# Altium schematic symbol library jlcpcb_2025_04_capacitors_extended_0201.schlib: 1175 symbols (part 4 of 7) (continued)
## GJM0335C1HR20BB01D
designator C?  Capacitance: 0.2pF  (hidden comment: *)
Capacitor, Ceramic (MLCC), 0.2pF, SMD 0201; Manufacturer: Murata Electronics; Manufacturer Part Number: GJM0335C1HR20BB01D; Package Size: 0201; JLCPCB Basic Part: No; JLCPCB Part Number: C913472; Supplier 1: LCSC; Category: Capacitors - MLCC; Supplier Part Number 1: C913472; RoHS: Yes; ComponentLink1Description: Datasheet; ComponentLink1URL: https://wmsc.lcsc.com/wmsc/upload/file/pdf/v2/lcsc/2308111814_Murata-Electronics-GJM0335C1HR20BB01D_C913472.pdf; ComponentLink2Description: JLCPCB Part URL; ComponentLink2URL: https://jlcpcb.com/partdetail/C913472; ComponentLink3Description: LCSC Part URL; ComponentLink3URL: https://lcsc.com/product-detail/Multilayer-Ceramic-Capacitors-MLCC---SMD-SMT_Murata-Electronics-Murata-Electronics-GJM0335C1HR20BB01D_C913472.html
footprint CAP-0201 (0201 (0603M) Capacitor)
pins: 1, 2

## GJM0335C1HR20WB01D
designator C?  Capacitance: 0.2pF  (hidden comment: *)
Capacitor, Ceramic (MLCC), 0.2pF, 50V, C0G, SMD 0201; Manufacturer: Murata Electronics; Manufacturer Part Number: GJM0335C1HR20WB01D; Package Size: 0201; JLCPCB Basic Part: No; JLCPCB Part Number: C2980610; Supplier 1: LCSC; Category: Capacitors - MLCC; Supplier Part Number 1: C2980610; Voltage Rating: 50V; Temperature Coefficient: C0G; RoHS: Yes; ComponentLink1Description: Datasheet; ComponentLink1URL: https://wmsc.lcsc.com/wmsc/upload/file/pdf/v2/lcsc/2203071730_Murata-Electronics-GJM0335C1HR20WB01D_C2980610.pdf; ComponentLink2Description: JLCPCB Part URL; ComponentLink2URL: https://jlcpcb.com/partdetail/C2980610; ComponentLink3Description: LCSC Part URL; ComponentLink3URL: https://lcsc.com/product-detail/Multilayer-Ceramic-Capacitors-MLCC---SMD-SMT_Murata-Electronics-Murata-Electronics-GJM0335C1HR20WB01D_C2980610.html
footprint CAP-0201 (0201 (0603M) Capacitor)
pins: 1, 2

## GJM0335C1HR30WB01D
designator C?  Capacitance: 0.3pF  (hidden comment: *)
Capacitor, Ceramic (MLCC), 0.3pF, 50V, C0G, SMD 0201; Manufacturer: Murata Electronics; Manufacturer Part Number: GJM0335C1HR30WB01D; Package Size: 0201; JLCPCB Basic Part: No; JLCPCB Part Number: C3904589; Supplier 1: LCSC; Category: Capacitors - MLCC; Supplier Part Number 1: C3904589; Voltage Rating: 50V; Temperature Coefficient: C0G; RoHS: Yes; ComponentLink1Description: Datasheet; ComponentLink1URL: https://wmsc.lcsc.com/wmsc/upload/file/pdf/v2/lcsc/2308111807_Murata-Electronics-GJM0335C1HR30WB01D_C3904589.pdf; ComponentLink2Description: JLCPCB Part URL; ComponentLink2URL: https://jlcpcb.com/partdetail/C3904589; ComponentLink3Description: LCSC Part URL; ComponentLink3URL: https://lcsc.com/product-detail/Multilayer-Ceramic-Capacitors-MLCC---SMD-SMT_Murata-Electronics-Murata-Electronics-GJM0335C1HR30WB01D_C3904589.html
footprint CAP-0201 (0201 (0603M) Capacitor)
pins: 1, 2

## GJM0335C1HR40WB01D
designator C?  Capacitance: 0.4pF  (hidden comment: *)
Capacitor, Ceramic (MLCC), 0.4pF, 50V, null, SMD 0201; Manufacturer: Murata Electronics; Manufacturer Part Number: GJM0335C1HR40WB01D; Package Size: 0201; JLCPCB Basic Part: No; JLCPCB Part Number: C2169044; Supplier 1: LCSC; Category: Capacitors - MLCC; Supplier Part Number 1: C2169044; Voltage Rating: 50V; Temperature Coefficient: null; RoHS: Yes; ComponentLink1Description: Datasheet; ComponentLink1URL: https://wmsc.lcsc.com/wmsc/upload/file/pdf/v2/lcsc/2202040330_Murata-Electronics-GJM0335C1HR40WB01D_C2169044.pdf; ComponentLink2Description: JLCPCB Part URL; ComponentLink2URL: https://jlcpcb.com/partdetail/C2169044; ComponentLink3Description: LCSC Part URL; ComponentLink3URL: https://lcsc.com/product-detail/Multilayer-Ceramic-Capacitors-MLCC---SMD-SMT_Murata-Electronics-Murata-Electronics-GJM0335C1HR40WB01D_C2169044.html
footprint CAP-0201 (0201 (0603M) Capacitor)
pins: 1, 2

## GJM0335C1HR50WB01D
designator C?  Capacitance: 0.5pF  (hidden comment: *)
Capacitor, Ceramic (MLCC), 0.5pF, null, null, SMD 0201; Manufacturer: Murata Electronics; Manufacturer Part Number: GJM0335C1HR50WB01D; Package Size: 0201; JLCPCB Basic Part: No; JLCPCB Part Number: C237424; Supplier 1: LCSC; Category: Capacitors - MLCC; Supplier Part Number 1: C237424; Voltage Rating: null; Temperature Coefficient: null; RoHS: Yes; ComponentLink1Description: Datasheet; ComponentLink1URL: https://wmsc.lcsc.com/wmsc/upload/file/pdf/v2/lcsc/2105241208_Murata-Electronics-GJM0335C1HR50WB01D_C237424.pdf; ComponentLink2Description: JLCPCB Part URL; ComponentLink2URL: https://jlcpcb.com/partdetail/C237424; ComponentLink3Description: LCSC Part URL; ComponentLink3URL: https://lcsc.com/product-detail/Multilayer-Ceramic-Capacitors-MLCC---SMD-SMT_Murata-Electronics-Murata-Electronics-GJM0335C1HR50WB01D_C237424.html
footprint CAP-0201 (0201 (0603M) Capacitor)
pins: 1, 2

## GJM0335C1HR60BB01D
designator C?  Capacitance: 0.6pF  (hidden comment: *)
Capacitor, Ceramic (MLCC), 0.6pF, 50V, C0G, SMD 0201; Manufacturer: Murata Electronics; Manufacturer Part Number: GJM0335C1HR60BB01D; Package Size: 0201; JLCPCB Basic Part: No; JLCPCB Part Number: C161296; Supplier 1: LCSC; Category: Capacitors - MLCC; Supplier Part Number 1: C161296; Voltage Rating: 50V; Temperature Coefficient: C0G; RoHS: Yes; ComponentLink1Description: Datasheet; ComponentLink1URL: https://wmsc.lcsc.com/wmsc/upload/file/pdf/v2/lcsc/1811081532_Murata-Electronics-GJM0335C1HR60BB01D_C161296.pdf; ComponentLink2Description: JLCPCB Part URL; ComponentLink2URL: https://jlcpcb.com/partdetail/C161296; ComponentLink3Description: LCSC Part URL; ComponentLink3URL: https://lcsc.com/product-detail/Multilayer-Ceramic-Capacitors-MLCC---SMD-SMT_Murata-Electronics-Murata-Electronics-GJM0335C1HR60BB01D_C161296.html
footprint CAP-0201 (0201 (0603M) Capacitor)
pins: 1, 2

## GJM0335C1HR60WB01D
designator C?  Capacitance: 0.6pF  (hidden comment: *)
Capacitor, Ceramic (MLCC), 0.6pF, 50V, C0G, SMD 0201; Manufacturer: Murata Electronics; Manufacturer Part Number: GJM0335C1HR60WB01D; Package Size: 0201; JLCPCB Basic Part: No; JLCPCB Part Number: C710747; Supplier 1: LCSC; Category: Capacitors - MLCC; Supplier Part Number 1: C710747; Voltage Rating: 50V; Temperature Coefficient: C0G; RoHS: Yes; ComponentLink1Description: Datasheet; ComponentLink1URL: https://wmsc.lcsc.com/wmsc/upload/file/pdf/v2/lcsc/2210190600_Murata-Electronics-GJM0335C1HR60WB01D_C710747.pdf; ComponentLink2Description: JLCPCB Part URL; ComponentLink2URL: https://jlcpcb.com/partdetail/C710747; ComponentLink3Description: LCSC Part URL; ComponentLink3URL: https://lcsc.com/product-detail/Multilayer-Ceramic-Capacitors-MLCC---SMD-SMT_Murata-Electronics-Murata-Electronics-GJM0335C1HR60WB01D_C710747.html
footprint CAP-0201 (0201 (0603M) Capacitor)
pins: 1, 2

## GJM0335C1HR75BB01D
designator C?  Capacitance: 0.75pF  (hidden comment: *)
Capacitor, Ceramic (MLCC), 0.75pF, SMD 0201; Manufacturer: Murata Electronics; Manufacturer Part Number: GJM0335C1HR75BB01D; Package Size: 0201; JLCPCB Basic Part: No; JLCPCB Part Number: C909840; Supplier 1: LCSC; Category: Capacitors - MLCC; Supplier Part Number 1: C909840; RoHS: Yes; ComponentLink1Description: Datasheet; ComponentLink1URL: https://wmsc.lcsc.com/wmsc/upload/file/pdf/v2/lcsc/2304140030_Murata-Electronics-GJM0335C1HR75BB01D_C909840.pdf; ComponentLink2Description: JLCPCB Part URL; ComponentLink2URL: https://jlcpcb.com/partdetail/C909840; ComponentLink3Description: LCSC Part URL; ComponentLink3URL: https://lcsc.com/product-detail/Multilayer-Ceramic-Capacitors-MLCC---SMD-SMT_Murata-Electronics-Murata-Electronics-GJM0335C1HR75BB01D_C909840.html
footprint CAP-0201 (0201 (0603M) Capacitor)
pins: 1, 2

## GJM0335C1HR80BB01D
designator C?  Capacitance: 0.8pF  (hidden comment: *)
Capacitor, Ceramic (MLCC), 0.8pF, 50V, C0G, SMD 0201; Manufacturer: Murata Electronics; Manufacturer Part Number: GJM0335C1HR80BB01D; Package Size: 0201; JLCPCB Basic Part: No; JLCPCB Part Number: C913438; Supplier 1: LCSC; Category: Capacitors - MLCC; Supplier Part Number 1: C913438; Voltage Rating: 50V; Temperature Coefficient: C0G; RoHS: Yes; ComponentLink1Description: Datasheet; ComponentLink1URL: https://wmsc.lcsc.com/wmsc/upload/file/pdf/v2/lcsc/2308111814_Murata-Electronics-GJM0335C1HR80BB01D_C913438.pdf; ComponentLink2Description: JLCPCB Part URL; ComponentLink2URL: https://jlcpcb.com/partdetail/C913438; ComponentLink3Description: LCSC Part URL; ComponentLink3URL: https://lcsc.com/product-detail/Multilayer-Ceramic-Capacitors-MLCC---SMD-SMT_Murata-Electronics-Murata-Electronics-GJM0335C1HR80BB01D_C913438.html
footprint CAP-0201 (0201 (0603M) Capacitor)
pins: 1, 2

## GJM0335C1HR80WB01D
designator C?  Capacitance: 0.8pF  (hidden comment: *)
Capacitor, Ceramic (MLCC), 0.8pF, 50V, C0G, SMD 0201; Manufacturer: Murata Electronics; Manufacturer Part Number: GJM0335C1HR80WB01D; Package Size: 0201; JLCPCB Basic Part: No; JLCPCB Part Number: C2981049; Supplier 1: LCSC; Category: Capacitors - MLCC; Supplier Part Number 1: C2981049; Voltage Rating: 50V; Temperature Coefficient: C0G; RoHS: Yes; ComponentLink1Description: Datasheet; ComponentLink1URL: https://wmsc.lcsc.com/wmsc/upload/file/pdf/v2/lcsc/2204111630_Murata-Electronics-GJM0335C1HR80WB01D_C2981049.pdf; ComponentLink2Description: JLCPCB Part URL; ComponentLink2URL: https://jlcpcb.com/partdetail/C2981049; ComponentLink3Description: LCSC Part URL; ComponentLink3URL: https://lcsc.com/product-detail/Multilayer-Ceramic-Capacitors-MLCC---SMD-SMT_Murata-Electronics-Murata-Electronics-GJM0335C1HR80WB01D_C2981049.html
footprint CAP-0201 (0201 (0603M) Capacitor)
pins: 1, 2

## GJM0335C1HR90WB01D
designator C?  Capacitance: 0.9pF  (hidden comment: *)
Capacitor, Ceramic (MLCC), 0.9pF, 50V, C0G, SMD 0201; Manufacturer: Murata Electronics; Manufacturer Part Number: GJM0335C1HR90WB01D; Package Size: 0201; JLCPCB Basic Part: No; JLCPCB Part Number: C237299; Supplier 1: LCSC; Category: Capacitors - MLCC; Supplier Part Number 1: C237299; Voltage Rating: 50V; Temperature Coefficient: C0G; RoHS: Yes; ComponentLink1Description: Datasheet; ComponentLink1URL: https://wmsc.lcsc.com/wmsc/upload/file/pdf/v2/lcsc/1912111437_Murata-Electronics-GJM0335C1HR90WB01D_C237299.pdf; ComponentLink2Description: JLCPCB Part URL; ComponentLink2URL: https://jlcpcb.com/partdetail/C237299; ComponentLink3Description: LCSC Part URL; ComponentLink3URL: https://lcsc.com/product-detail/Multilayer-Ceramic-Capacitors-MLCC---SMD-SMT_Murata-Electronics-Murata-Electronics-GJM0335C1HR90WB01D_C237299.html
footprint CAP-0201 (0201 (0603M) Capacitor)
pins: 1, 2

## GJM0336C1E8R2BB01D
designator C?  Capacitance: 8.2pF  (hidden comment: *)
Capacitor, Ceramic (MLCC), 8.2pF, 25V, C0H, SMD 0201; Manufacturer: Murata Electronics; Manufacturer Part Number: GJM0336C1E8R2BB01D; Package Size: 0201; JLCPCB Basic Part: No; JLCPCB Part Number: C161301; Supplier 1: LCSC; Category: Capacitors - MLCC; Supplier Part Number 1: C161301; Voltage Rating: 25V; Temperature Coefficient: C0H; RoHS: Yes; ComponentLink1Description: Datasheet; ComponentLink1URL: https://wmsc.lcsc.com/wmsc/upload/file/pdf/v2/lcsc/1811081521_Murata-Electronics-GJM0336C1E8R2BB01D_C161301.pdf; ComponentLink2Description: JLCPCB Part URL; ComponentLink2URL: https://jlcpcb.com/partdetail/C161301; ComponentLink3Description: LCSC Part URL; ComponentLink3URL: https://lcsc.com/product-detail/Multilayer-Ceramic-Capacitors-MLCC---SMD-SMT_Murata-Electronics-Murata-Electronics-GJM0336C1E8R2BB01D_C161301.html
footprint CAP-0201 (0201 (0603M) Capacitor)
pins: 1, 2

## GJM0336C1E9R0BB01D
designator C?  Capacitance: 9pF  (hidden comment: *)
Capacitor, Ceramic (MLCC), 9pF, 25V, C0H, SMD 0201; Manufacturer: Murata Electronics; Manufacturer Part Number: GJM0336C1E9R0BB01D; Package Size: 0201; JLCPCB Basic Part: No; JLCPCB Part Number: C161302; Supplier 1: LCSC; Category: Capacitors - MLCC; Supplier Part Number 1: C161302; Voltage Rating: 25V; Temperature Coefficient: C0H; RoHS: Yes; ComponentLink1Description: Datasheet; ComponentLink1URL: https://wmsc.lcsc.com/wmsc/upload/file/pdf/v2/lcsc/1811081544_Murata-Electronics-GJM0336C1E9R0BB01D_C161302.pdf; ComponentLink2Description: JLCPCB Part URL; ComponentLink2URL: https://jlcpcb.com/partdetail/C161302; ComponentLink3Description: LCSC Part URL; ComponentLink3URL: https://lcsc.com/product-detail/Multilayer-Ceramic-Capacitors-MLCC---SMD-SMT_Murata-Electronics-Murata-Electronics-GJM0336C1E9R0BB01D_C161302.html
footprint CAP-0201 (0201 (0603M) Capacitor)
pins: 1, 2

## GJM0336C1E9R0DB01D
designator C?  Capacitance: 9pF  (hidden comment: *)
Capacitor, Ceramic (MLCC), 9pF, 25V, C0H, SMD 0201; Manufacturer: Murata Electronics; Manufacturer Part Number: GJM0336C1E9R0DB01D; Package Size: 0201; JLCPCB Basic Part: No; JLCPCB Part Number: C161303; Supplier 1: LCSC; Category: Capacitors - MLCC; Supplier Part Number 1: C161303; Voltage Rating: 25V; Temperature Coefficient: C0H; RoHS: Yes; ComponentLink1Description: Datasheet; ComponentLink1URL: https://wmsc.lcsc.com/wmsc/upload/file/pdf/v2/lcsc/1811081525_Murata-Electronics-GJM0336C1E9R0DB01D_C161303.pdf; ComponentLink2Description: JLCPCB Part URL; ComponentLink2URL: https://jlcpcb.com/partdetail/C161303; ComponentLink3Description: LCSC Part URL; ComponentLink3URL: https://lcsc.com/product-detail/Multilayer-Ceramic-Capacitors-MLCC---SMD-SMT_Murata-Electronics-Murata-Electronics-GJM0336C1E9R0DB01D_C161303.html
footprint CAP-0201 (0201 (0603M) Capacitor)
pins: 1, 2

## GJM0336C1E120JB01D
designator C?  Capacitance: 12pF  (hidden comment: *)
Capacitor, Ceramic (MLCC), 12pF, ±5%, 25V, ±5%, SMD 0201; Manufacturer: Murata Electronics; Manufacturer Part Number: GJM0336C1E120JB01D; Package Size: 0201; JLCPCB Basic Part: No; JLCPCB Part Number: C426076; Supplier 1: LCSC; Category: Capacitors - MLCC; Supplier Part Number 1: C426076; Tolerance: ±5%; Voltage Rating: 25V; RoHS: Yes; ComponentLink1Description: Datasheet; ComponentLink1URL: https://wmsc.lcsc.com/wmsc/upload/file/pdf/v2/lcsc/2304140030_Murata-Electronics-GJM0336C1E120JB01D_C426076.pdf; ComponentLink2Description: JLCPCB Part URL; ComponentLink2URL: https://jlcpcb.com/partdetail/C426076; ComponentLink3Description: LCSC Part URL; ComponentLink3URL: https://lcsc.com/product-detail/Multilayer-Ceramic-Capacitors-MLCC---SMD-SMT_Murata-Electronics-Murata-Electronics-GJM0336C1E120JB01D_C426076.html
footprint CAP-0201 (0201 (0603M) Capacitor)
pins: 1, 2

## GJM0336C1E150GB01D
designator C?  Capacitance: 15pF  (hidden comment: *)
Capacitor, Ceramic (MLCC), 15pF, ±2%, 25V, C0H, ±2%, SMD 0201; Manufacturer: Murata Electronics; Manufacturer Part Number: GJM0336C1E150GB01D; Package Size: 0201; JLCPCB Basic Part: No; JLCPCB Part Number: C161298; Supplier 1: LCSC; Category: Capacitors - MLCC; Supplier Part Number 1: C161298; Tolerance: ±2%; Voltage Rating: 25V; Temperature Coefficient: C0H; RoHS: Yes; ComponentLink1Description: Datasheet; ComponentLink1URL: https://wmsc.lcsc.com/wmsc/upload/file/pdf/v2/lcsc/2304140030_Murata-Electronics-GJM0336C1E150GB01D_C161298.pdf; ComponentLink2Description: JLCPCB Part URL; ComponentLink2URL: https://jlcpcb.com/partdetail/C161298; ComponentLink3Description: LCSC Part URL; ComponentLink3URL: https://lcsc.com/product-detail/Multilayer-Ceramic-Capacitors-MLCC---SMD-SMT_Murata-Electronics-Murata-Electronics-GJM0336C1E150GB01D_C161298.html
footprint CAP-0201 (0201 (0603M) Capacitor)
pins: 1, 2

## GJM0336C1E200JB01D
designator C?  Capacitance: 20pF  (hidden comment: *)
Capacitor, Ceramic (MLCC), 20pF, ±5%, 25V, C0H, ±5%, SMD 0201; Manufacturer: Murata Electronics; Manufacturer Part Number: GJM0336C1E200JB01D; Package Size: 0201; JLCPCB Basic Part: No; JLCPCB Part Number: C161300; Supplier 1: LCSC; Category: Capacitors - MLCC; Supplier Part Number 1: C161300; Tolerance: ±5%; Voltage Rating: 25V; Temperature Coefficient: C0H; RoHS: Yes; ComponentLink1Description: Datasheet; ComponentLink1URL: https://wmsc.lcsc.com/wmsc/upload/file/pdf/v2/lcsc/2304140030_Murata-Electronics-GJM0336C1E200JB01D_C161300.pdf; ComponentLink2Description: JLCPCB Part URL; ComponentLink2URL: https://jlcpcb.com/partdetail/C161300; ComponentLink3Description: LCSC Part URL; ComponentLink3URL: https://lcsc.com/product-detail/Multilayer-Ceramic-Capacitors-MLCC---SMD-SMT_Murata-Electronics-Murata-Electronics-GJM0336C1E200JB01D_C161300.html
footprint CAP-0201 (0201 (0603M) Capacitor)
pins: 1, 2

## GRJ033R61A105ME11D
designator C?  Capacitance: 1uF  (hidden comment: *)
Capacitor, Ceramic (MLCC), 1uF, ±20%, 10V, X5R, ±20%, SMD 0201; Manufacturer: Murata Electronics; Manufacturer Part Number: GRJ033R61A105ME11D; Package Size: 0201; JLCPCB Basic Part: No; JLCPCB Part Number: C426073; Supplier 1: LCSC; Category: Capacitors - MLCC; Supplier Part Number 1: C426073; Tolerance: ±20%; Voltage Rating: 10V; Temperature Coefficient: X5R; RoHS: Yes; ComponentLink1Description: Datasheet; ComponentLink1URL: https://wmsc.lcsc.com/wmsc/upload/file/pdf/v2/lcsc/2304140030_Murata-Electronics-GRJ033R61A105ME11D_C426073.pdf; ComponentLink2Description: JLCPCB Part URL; ComponentLink2URL: https://jlcpcb.com/partdetail/C426073; ComponentLink3Description: LCSC Part URL; ComponentLink3URL: https://lcsc.com/product-detail/Multilayer-Ceramic-Capacitors-MLCC---SMD-SMT_Murata-Electronics-Murata-Electronics-GRJ033R61A105ME11D_C426073.html
footprint CAP-0201 (0201 (0603M) Capacitor)
pins: 1, 2

## GRM032R60J104KE15D
designator C?  Capacitance: 100nF  (hidden comment: *)
Capacitor, Ceramic (MLCC), 100nF, ±10%, 6.3V, X5R, ±10%, SMD 0201; Manufacturer: Murata Electronics; Manufacturer Part Number: GRM032R60J104KE15D; Package Size: 0201; JLCPCB Basic Part: No; JLCPCB Part Number: C237457; Supplier 1: LCSC; Category: Capacitors - MLCC; Supplier Part Number 1: C237457; Tolerance: ±10%; Voltage Rating: 6.3V; Temperature Coefficient: X5R; RoHS: Yes; ComponentLink1Description: Datasheet; ComponentLink1URL: https://wmsc.lcsc.com/wmsc/upload/file/pdf/v2/lcsc/1912111437_Murata-Electronics-GRM032R60J104KE15D_C237457.pdf; ComponentLink2Description: JLCPCB Part URL; ComponentLink2URL: https://jlcpcb.com/partdetail/C237457; ComponentLink3Description: LCSC Part URL; ComponentLink3URL: https://lcsc.com/product-detail/Multilayer-Ceramic-Capacitors-MLCC---SMD-SMT_Murata-Electronics-Murata-Electronics-GRM032R60J104KE15D_C237457.html
footprint CAP-0201 (0201 (0603M) Capacitor)
pins: 1, 2

## GRM032R60J105ME05D
designator C?  Capacitance: 1uF  (hidden comment: *)
Capacitor, Ceramic (MLCC), 1uF, ±20%, 6.3V, X5R, ±20%, SMD 0201; Manufacturer: Murata Electronics; Manufacturer Part Number: GRM032R60J105ME05D; Package Size: 0201; JLCPCB Basic Part: No; JLCPCB Part Number: C237458; Supplier 1: LCSC; Category: Capacitors - MLCC; Supplier Part Number 1: C237458; Tolerance: ±20%; Voltage Rating: 6.3V; Temperature Coefficient: X5R; RoHS: Yes; ComponentLink1Description: Datasheet; ComponentLink1URL: https://wmsc.lcsc.com/wmsc/upload/file/pdf/v2/lcsc/2109152030_Murata-Electronics-GRM032R60J105ME05D_C237458.pdf; ComponentLink2Description: JLCPCB Part URL; ComponentLink2URL: https://jlcpcb.com/partdetail/C237458; ComponentLink3Description: LCSC Part URL; ComponentLink3URL: https://lcsc.com/product-detail/Multilayer-Ceramic-Capacitors-MLCC---SMD-SMT_Murata-Electronics-Murata-Electronics-GRM032R60J105ME05D_C237458.html
footprint CAP-0201 (0201 (0603M) Capacitor)
pins: 1, 2

## GRM033B11E102KA01D
designator C?  Capacitance: 1nF  (hidden comment: *)
Capacitor, Ceramic (MLCC), 1nF, ±10%, 25V, B, ±10%, SMD 0201; Manufacturer: Murata Electronics; Manufacturer Part Number: GRM033B11E102KA01D; Package Size: 0201; JLCPCB Basic Part: No; JLCPCB Part Number: C576430; Supplier 1: LCSC; Category: Capacitors - MLCC; Supplier Part Number 1: C576430; Tolerance: ±10%; Voltage Rating: 25V; Temperature Coefficient: B; RoHS: Yes; ComponentLink1Description: Datasheet; ComponentLink1URL: https://wmsc.lcsc.com/wmsc/upload/file/pdf/v2/lcsc/2308111810_Murata-Electronics-GRM033B11E102KA01D_C576430.pdf; ComponentLink2Description: JLCPCB Part URL; ComponentLink2URL: https://jlcpcb.com/partdetail/C576430; ComponentLink3Description: LCSC Part URL; ComponentLink3URL: https://lcsc.com/product-detail/Multilayer-Ceramic-Capacitors-MLCC---SMD-SMT_Murata-Electronics-Murata-Electronics-GRM033B11E102KA01D_C576430.html
footprint CAP-0201 (0201 (0603M) Capacitor)
pins: 1, 2

## GRM033B30J104KE18D
designator C?  Capacitance: 100nF  (hidden comment: *)
Capacitor, Ceramic (MLCC), 100nF, ±10%, ±10%, SMD 0201; Manufacturer: Murata Electronics; Manufacturer Part Number: GRM033B30J104KE18D; Package Size: 0201; JLCPCB Basic Part: No; JLCPCB Part Number: C576431; Supplier 1: LCSC; Category: Capacitors - MLCC; Supplier Part Number 1: C576431; Tolerance: ±10%; RoHS: Yes; ComponentLink1Description: Datasheet; ComponentLink1URL: https://wmsc.lcsc.com/wmsc/upload/file/pdf/v2/lcsc/2105241333_Murata-Electronics-GRM033B30J104KE18D_C576431.pdf; ComponentLink2Description: JLCPCB Part URL; ComponentLink2URL: https://jlcpcb.com/partdetail/C576431; ComponentLink3Description: LCSC Part URL; ComponentLink3URL: https://lcsc.com/product-detail/Multilayer-Ceramic-Capacitors-MLCC---SMD-SMT_Murata-Electronics-Murata-Electronics-GRM033B30J104KE18D_C576431.html
footprint CAP-0201 (0201 (0603M) Capacitor)
pins: 1, 2

## GRM033B31A104KE15D
designator C?  Capacitance: 100nF  (hidden comment: *)
Capacitor, Ceramic (MLCC), 100nF, ±10%, ±10%, SMD 0201; Manufacturer: Murata Electronics; Manufacturer Part Number: GRM033B31A104KE15D; Package Size: 0201; JLCPCB Basic Part: No; JLCPCB Part Number: C913653; Supplier 1: LCSC; Category: Capacitors - MLCC; Supplier Part Number 1: C913653; Tolerance: ±10%; RoHS: Yes; ComponentLink1Description: Datasheet; ComponentLink1URL: https://wmsc.lcsc.com/wmsc/upload/file/pdf/v2/lcsc/2201131300_Murata-Electronics-GRM033B31A104KE15D_C913653.pdf; ComponentLink2Description: JLCPCB Part URL; ComponentLink2URL: https://jlcpcb.com/partdetail/C913653; ComponentLink3Description: LCSC Part URL; ComponentLink3URL: https://lcsc.com/product-detail/Multilayer-Ceramic-Capacitors-MLCC---SMD-SMT_Murata-Electronics-Murata-Electronics-GRM033B31A104KE15D_C913653.html
footprint CAP-0201 (0201 (0603M) Capacitor)
pins: 1, 2

## GRM033B31C222KA87D
designator C?  Capacitance: 2.2nF  (hidden comment: *)
Capacitor, Ceramic (MLCC), 2.2nF, ±10%, 16V, B, ±10%, SMD 0201; Manufacturer: Murata Electronics; Manufacturer Part Number: GRM033B31C222KA87D; Package Size: 0201; JLCPCB Basic Part: No; JLCPCB Part Number: C397294; Supplier 1: LCSC; Category: Capacitors - MLCC; Supplier Part Number 1: C397294; Tolerance: ±10%; Voltage Rating: 16V; Temperature Coefficient: B; RoHS: Yes; ComponentLink1Description: Datasheet; ComponentLink1URL: https://wmsc.lcsc.com/wmsc/upload/file/pdf/v2/lcsc/1912111437_Murata-Electronics-GRM033B31C222KA87D_C397294.pdf; ComponentLink2Description: JLCPCB Part URL; ComponentLink2URL: https://jlcpcb.com/partdetail/C397294; ComponentLink3Description: LCSC Part URL; ComponentLink3URL: https://lcsc.com/product-detail/Multilayer-Ceramic-Capacitors-MLCC---SMD-SMT_Murata-Electronics-Murata-Electronics-GRM033B31C222KA87D_C397294.html
footprint CAP-0201 (0201 (0603M) Capacitor)
pins: 1, 2

## GRM033C70J104KE14D
designator C?  Capacitance: 100nF  (hidden comment: *)
Capacitor, Ceramic (MLCC), 100nF, ±10%, 6.3V, X7S, ±10%, SMD 0201; Manufacturer: Murata Electronics; Manufacturer Part Number: GRM033C70J104KE14D; Package Size: 0201; JLCPCB Basic Part: No; JLCPCB Part Number: C161453; Supplier 1: LCSC; Category: Capacitors - MLCC; Supplier Part Number 1: C161453; Tolerance: ±10%; Voltage Rating: 6.3V; Temperature Coefficient: X7S; RoHS: Yes; ComponentLink1Description: Datasheet; ComponentLink1URL: https://wmsc.lcsc.com/wmsc/upload/file/pdf/v2/lcsc/1811081551_Murata-Electronics-GRM033C70J104KE14D_C161453.pdf; ComponentLink2Description: JLCPCB Part URL; ComponentLink2URL: https://jlcpcb.com/partdetail/C161453; ComponentLink3Description: LCSC Part URL; ComponentLink3URL: https://lcsc.com/product-detail/Multilayer-Ceramic-Capacitors-MLCC---SMD-SMT_Murata-Electronics-Murata-Electronics-GRM033C70J104KE14D_C161453.html
footprint CAP-0201 (0201 (0603M) Capacitor)
pins: 1, 2

## GRM033C71C104KE14D
designator C?  Capacitance: 100nF  (hidden comment: *)
Capacitor, Ceramic (MLCC), 100nF, ±10%, 16V, X7S, ±10%, SMD 0201; Manufacturer: Murata Electronics; Manufacturer Part Number: GRM033C71C104KE14D; Package Size: 0201; JLCPCB Basic Part: No; JLCPCB Part Number: C85923; Supplier 1: LCSC; Category: Capacitors - MLCC; Supplier Part Number 1: C85923; Tolerance: ±10%; Voltage Rating: 16V; Temperature Coefficient: X7S; RoHS: Yes; ComponentLink1Description: Datasheet; ComponentLink1URL: https://wmsc.lcsc.com/wmsc/upload/file/pdf/v2/lcsc/2304140030_Murata-Electronics-GRM033C71C104KE14D_C85923.pdf; ComponentLink2Description: JLCPCB Part URL; ComponentLink2URL: https://jlcpcb.com/partdetail/C85923; ComponentLink3Description: LCSC Part URL; ComponentLink3URL: https://lcsc.com/product-detail/Multilayer-Ceramic-Capacitors-MLCC---SMD-SMT_Murata-Electronics-Murata-Electronics-GRM033C71C104KE14D_C85923.html
footprint CAP-0201 (0201 (0603M) Capacitor)
pins: 1, 2

## GRM033C71C104ME14D
designator C?  Capacitance: 100nF  (hidden comment: *)
Capacitor, Ceramic (MLCC), 100nF, ±20%, 16V, X7S, ±20%, SMD 0201; Manufacturer: Murata Electronics; Manufacturer Part Number: GRM033C71C104ME14D; Package Size: 0201; JLCPCB Basic Part: No; JLCPCB Part Number: C907967; Supplier 1: LCSC; Category: Capacitors - MLCC; Supplier Part Number 1: C907967; Tolerance: ±20%; Voltage Rating: 16V; Temperature Coefficient: X7S; RoHS: Yes; ComponentLink1Description: Datasheet; ComponentLink1URL: https://wmsc.lcsc.com/wmsc/upload/file/pdf/v2/lcsc/2206071416_Murata-Electronics-GRM033C71C104ME14D_C907967.pdf; ComponentLink2Description: JLCPCB Part URL; ComponentLink2URL: https://jlcpcb.com/partdetail/C907967; ComponentLink3Description: LCSC Part URL; ComponentLink3URL: https://lcsc.com/product-detail/Multilayer-Ceramic-Capacitors-MLCC---SMD-SMT_Murata-Electronics-Murata-Electronics-GRM033C71C104ME14D_C907967.html
footprint CAP-0201 (0201 (0603M) Capacitor)
pins: 1, 2

## GRM033C80G105MEA2D
designator C?  Capacitance: 1uF  (hidden comment: *)
Capacitor, Ceramic (MLCC), 1uF, ±20%, 4V, X6S, ±20%, SMD 0201; Manufacturer: Murata Electronics; Manufacturer Part Number: GRM033C80G105MEA2D; Package Size: 0201; JLCPCB Basic Part: No; JLCPCB Part Number: C161455; Supplier 1: LCSC; Category: Capacitors - MLCC; Supplier Part Number 1: C161455; Tolerance: ±20%; Voltage Rating: 4V; Temperature Coefficient: X6S; RoHS: Yes; ComponentLink1Description: Datasheet; ComponentLink1URL: https://wmsc.lcsc.com/wmsc/upload/file/pdf/v2/lcsc/2304140030_Murata-Electronics-GRM033C80G105MEA2D_C161455.pdf; ComponentLink2Description: JLCPCB Part URL; ComponentLink2URL: https://jlcpcb.com/partdetail/C161455; ComponentLink3Description: LCSC Part URL; ComponentLink3URL: https://lcsc.com/product-detail/Multilayer-Ceramic-Capacitors-MLCC---SMD-SMT_Murata-Electronics-Murata-Electronics-GRM033C80G105MEA2D_C161455.html
footprint CAP-0201 (0201 (0603M) Capacitor)
pins: 1, 2

## GRM033C80G225ME01D
designator C?  Capacitance: 2.2uF  (hidden comment: *)
Capacitor, Ceramic (MLCC), 2.2uF, ±20%, 4V, X6S, ±20%, SMD 0201; Manufacturer: Murata Electronics; Manufacturer Part Number: GRM033C80G225ME01D; Package Size: 0201; JLCPCB Basic Part: No; JLCPCB Part Number: C3875472; Supplier 1: LCSC; Category: Capacitors - MLCC; Supplier Part Number 1: C3875472; Tolerance: ±20%; Voltage Rating: 4V; Temperature Coefficient: X6S; RoHS: Yes; ComponentLink1Description: Datasheet; ComponentLink1URL: https://wmsc.lcsc.com/wmsc/upload/file/pdf/v2/lcsc/2308111756_Murata-Electronics-GRM033C80G225ME01D_C3875472.pdf; ComponentLink2Description: JLCPCB Part URL; ComponentLink2URL: https://jlcpcb.com/partdetail/C3875472; ComponentLink3Description: LCSC Part URL; ComponentLink3URL: https://lcsc.com/product-detail/Multilayer-Ceramic-Capacitors-MLCC---SMD-SMT_Murata-Electronics-Murata-Electronics-GRM033C80G225ME01D_C3875472.html
footprint CAP-0201 (0201 (0603M) Capacitor)
pins: 1, 2

## GRM033C80J104KE15D
designator C?  Capacitance: 100nF  (hidden comment: *)
Capacitor, Ceramic (MLCC), 100nF, ±10%, 6.3V, X6S, ±10%, SMD 0201; Manufacturer: Murata Electronics; Manufacturer Part Number: GRM033C80J104KE15D; Package Size: 0201; JLCPCB Basic Part: No; JLCPCB Part Number: C415519; Supplier 1: LCSC; Category: Capacitors - MLCC; Supplier Part Number 1: C415519; Tolerance: ±10%; Voltage Rating: 6.3V; Temperature Coefficient: X6S; RoHS: Yes; ComponentLink1Description: Datasheet; ComponentLink1URL: https://wmsc.lcsc.com/wmsc/upload/file/pdf/v2/lcsc/2304140030_Murata-Electronics-GRM033C80J104KE15D_C415519.pdf; ComponentLink2Description: JLCPCB Part URL; ComponentLink2URL: https://jlcpcb.com/partdetail/C415519; ComponentLink3Description: LCSC Part URL; ComponentLink3URL: https://lcsc.com/product-detail/Multilayer-Ceramic-Capacitors-MLCC---SMD-SMT_Murata-Electronics-Murata-Electronics-GRM033C80J104KE15D_C415519.html
footprint CAP-0201 (0201 (0603M) Capacitor)
pins: 1, 2

## GRM033C80J104KE84D
designator C?  Capacitance: 100nF  (hidden comment: *)
Capacitor, Ceramic (MLCC), 100nF, ±10%, 6.3V, X6S, ±10%, SMD 0201; Manufacturer: Murata Electronics; Manufacturer Part Number: GRM033C80J104KE84D; Package Size: 0201; JLCPCB Basic Part: No; JLCPCB Part Number: C161456; Supplier 1: LCSC; Category: Capacitors - MLCC; Supplier Part Number 1: C161456; Tolerance: ±10%; Voltage Rating: 6.3V; Temperature Coefficient: X6S; RoHS: Yes; ComponentLink1Description: Datasheet; ComponentLink1URL: https://wmsc.lcsc.com/wmsc/upload/file/pdf/v2/lcsc/1811081530_Murata-Electronics-GRM033C80J104KE84D_C161456.pdf; ComponentLink2Description: JLCPCB Part URL; ComponentLink2URL: https://jlcpcb.com/partdetail/C161456; ComponentLink3Description: LCSC Part URL; ComponentLink3URL: https://lcsc.com/product-detail/Multilayer-Ceramic-Capacitors-MLCC---SMD-SMT_Murata-Electronics-Murata-Electronics-GRM033C80J104KE84D_C161456.html
footprint CAP-0201 (0201 (0603M) Capacitor)
pins: 1, 2

## GRM033C80J223KE01D
designator C?  Capacitance: 22nF  (hidden comment: *)
Capacitor, Ceramic (MLCC), 22nF, ±10%, 6.3V, X6S, ±10%, SMD 0201; Manufacturer: Murata Electronics; Manufacturer Part Number: GRM033C80J223KE01D; Package Size: 0201; JLCPCB Basic Part: No; JLCPCB Part Number: C668343; Supplier 1: LCSC; Category: Capacitors - MLCC; Supplier Part Number 1: C668343; Tolerance: ±10%; Voltage Rating: 6.3V; Temperature Coefficient: X6S; RoHS: Yes; ComponentLink1Description: Datasheet; ComponentLink1URL: https://wmsc.lcsc.com/wmsc/upload/file/pdf/v2/lcsc/2105241313_Murata-Electronics-GRM033C80J223KE01D_C668343.pdf; ComponentLink2Description: JLCPCB Part URL; ComponentLink2URL: https://jlcpcb.com/partdetail/C668343; ComponentLink3Description: LCSC Part URL; ComponentLink3URL: https://lcsc.com/product-detail/Multilayer-Ceramic-Capacitors-MLCC---SMD-SMT_Murata-Electronics-Murata-Electronics-GRM033C80J223KE01D_C668343.html
footprint CAP-0201 (0201 (0603M) Capacitor)
pins: 1, 2

## GRM033C80J224KE90D
designator C?  Capacitance: 220nF  (hidden comment: *)
Capacitor, Ceramic (MLCC), 220nF, ±10%, 6.3V, X6S, ±10%, SMD 0201; Manufacturer: Murata Electronics; Manufacturer Part Number: GRM033C80J224KE90D; Package Size: 0201; JLCPCB Basic Part: No; JLCPCB Part Number: C576433; Supplier 1: LCSC; Category: Capacitors - MLCC; Supplier Part Number 1: C576433; Tolerance: ±10%; Voltage Rating: 6.3V; Temperature Coefficient: X6S; RoHS: Yes; ComponentLink1Description: Datasheet; ComponentLink1URL: https://wmsc.lcsc.com/wmsc/upload/file/pdf/v2/lcsc/2103161033_Murata-Electronics-GRM033C80J224KE90D_C576433.pdf; ComponentLink2Description: JLCPCB Part URL; ComponentLink2URL: https://jlcpcb.com/partdetail/C576433; ComponentLink3Description: LCSC Part URL; ComponentLink3URL: https://lcsc.com/product-detail/Multilayer-Ceramic-Capacitors-MLCC---SMD-SMT_Murata-Electronics-Murata-Electronics-GRM033C80J224KE90D_C576433.html
footprint CAP-0201 (0201 (0603M) Capacitor)
pins: 1, 2

## GRM033C80J224ME90D
designator C?  Capacitance: 220nF  (hidden comment: *)
Capacitor, Ceramic (MLCC), 220nF, ±20%, 6.3V, X6S, ±20%, SMD 0201; Manufacturer: Murata Electronics; Manufacturer Part Number: GRM033C80J224ME90D; Package Size: 0201; JLCPCB Basic Part: No; JLCPCB Part Number: C161457; Supplier 1: LCSC; Category: Capacitors - MLCC; Supplier Part Number 1: C161457; Tolerance: ±20%; Voltage Rating: 6.3V; Temperature Coefficient: X6S; RoHS: Yes; ComponentLink1Description: Datasheet; ComponentLink1URL: https://wmsc.lcsc.com/wmsc/upload/file/pdf/v2/lcsc/2304140030_Murata-Electronics-GRM033C80J224ME90D_C161457.pdf; ComponentLink2Description: JLCPCB Part URL; ComponentLink2URL: https://jlcpcb.com/partdetail/C161457; ComponentLink3Description: LCSC Part URL; ComponentLink3URL: https://lcsc.com/product-detail/Multilayer-Ceramic-Capacitors-MLCC---SMD-SMT_Murata-Electronics-Murata-Electronics-GRM033C80J224ME90D_C161457.html
footprint CAP-0201 (0201 (0603M) Capacitor)
pins: 1, 2

## GRM033C80J473KE19D
designator C?  Capacitance: 47nF  (hidden comment: *)
Capacitor, Ceramic (MLCC), 47nF, ±10%, 6.3V, X6S, ±10%, SMD 0201; Manufacturer: Murata Electronics; Manufacturer Part Number: GRM033C80J473KE19D; Package Size: 0201; JLCPCB Basic Part: No; JLCPCB Part Number: C782148; Supplier 1: LCSC; Category: Capacitors - MLCC; Supplier Part Number 1: C782148; Tolerance: ±10%; Voltage Rating: 6.3V; Temperature Coefficient: X6S; RoHS: Yes; ComponentLink1Description: Datasheet; ComponentLink1URL: https://wmsc.lcsc.com/wmsc/upload/file/pdf/v2/lcsc/2304140030_Murata-Electronics-GRM033C80J473KE19D_C782148.pdf; ComponentLink2Description: JLCPCB Part URL; ComponentLink2URL: https://jlcpcb.com/partdetail/C782148; ComponentLink3Description: LCSC Part URL; ComponentLink3URL: https://lcsc.com/product-detail/Multilayer-Ceramic-Capacitors-MLCC---SMD-SMT_Murata-Electronics-Murata-Electronics-GRM033C80J473KE19D_C782148.html
footprint CAP-0201 (0201 (0603M) Capacitor)
pins: 1, 2

## GRM033C80J473ME19D
designator C?  Capacitance: 47nF  (hidden comment: *)
Capacitor, Ceramic (MLCC), 47nF, ±20%, 6.3V, X6S, ±20%, SMD 0201; Manufacturer: Murata Electronics; Manufacturer Part Number: GRM033C80J473ME19D; Package Size: 0201; JLCPCB Basic Part: No; JLCPCB Part Number: C710814; Supplier 1: LCSC; Category: Capacitors - MLCC; Supplier Part Number 1: C710814; Tolerance: ±20%; Voltage Rating: 6.3V; Temperature Coefficient: X6S; RoHS: Yes; ComponentLink1Description: Datasheet; ComponentLink1URL: https://wmsc.lcsc.com/wmsc/upload/file/pdf/v2/lcsc/2009181535_Murata-Electronics-GRM033C80J473ME19D_C710814.pdf; ComponentLink2Description: JLCPCB Part URL; ComponentLink2URL: https://jlcpcb.com/partdetail/C710814; ComponentLink3Description: LCSC Part URL; ComponentLink3URL: https://lcsc.com/product-detail/Multilayer-Ceramic-Capacitors-MLCC---SMD-SMT_Murata-Electronics-Murata-Electronics-GRM033C80J473ME19D_C710814.html
footprint CAP-0201 (0201 (0603M) Capacitor)
pins: 1, 2

## GRM033C81A104KE14D
designator C?  Capacitance: 100nF  (hidden comment: *)
Capacitor, Ceramic (MLCC), 100nF, ±10%, 10V, X6S, ±10%, SMD 0201; Manufacturer: Murata Electronics; Manufacturer Part Number: GRM033C81A104KE14D; Package Size: 0201; JLCPCB Basic Part: No; JLCPCB Part Number: C710815; Supplier 1: LCSC; Category: Capacitors - MLCC; Supplier Part Number 1: C710815; Tolerance: ±10%; Voltage Rating: 10V; Temperature Coefficient: X6S; RoHS: Yes; ComponentLink1Description: Datasheet; ComponentLink1URL: https://wmsc.lcsc.com/wmsc/upload/file/pdf/v2/lcsc/2103161034_Murata-Electronics-GRM033C81A104KE14D_C710815.pdf; ComponentLink2Description: JLCPCB Part URL; ComponentLink2URL: https://jlcpcb.com/partdetail/C710815; ComponentLink3Description: LCSC Part URL; ComponentLink3URL: https://lcsc.com/product-detail/Multilayer-Ceramic-Capacitors-MLCC---SMD-SMT_Murata-Electronics-Murata-Electronics-GRM033C81A104KE14D_C710815.html
footprint CAP-0201 (0201 (0603M) Capacitor)
pins: 1, 2

## GRM033C81E103KE14D
designator C?  Capacitance: 10nF  (hidden comment: *)
Capacitor, Ceramic (MLCC), 10nF, ±10%, 25V, X6S, ±10%, SMD 0201; Manufacturer: Murata Electronics; Manufacturer Part Number: GRM033C81E103KE14D; Package Size: 0201; JLCPCB Basic Part: No; JLCPCB Part Number: C3899136; Supplier 1: LCSC; Category: Capacitors - MLCC; Supplier Part Number 1: C3899136; Tolerance: ±10%; Voltage Rating: 25V; Temperature Coefficient: X6S; RoHS: Yes; ComponentLink1Description: Datasheet; ComponentLink1URL: https://wmsc.lcsc.com/wmsc/upload/file/pdf/v2/lcsc/2308111502_Murata-Electronics-GRM033C81E103KE14D_C3899136.pdf; ComponentLink2Description: JLCPCB Part URL; ComponentLink2URL: https://jlcpcb.com/partdetail/C3899136; ComponentLink3Description: LCSC Part URL; ComponentLink3URL: https://lcsc.com/product-detail/Multilayer-Ceramic-Capacitors-MLCC---SMD-SMT_Murata-Electronics-Murata-Electronics-GRM033C81E103KE14D_C3899136.html
footprint CAP-0201 (0201 (0603M) Capacitor)
pins: 1, 2

## GRM033C81E104ME14D
designator C?  Capacitance: 100nF  (hidden comment: *)
Capacitor, Ceramic (MLCC), 100nF, ±20%, 25V, X6S, ±20%, SMD 0201; Manufacturer: Murata Electronics; Manufacturer Part Number: GRM033C81E104ME14D; Package Size: 0201; JLCPCB Basic Part: No; JLCPCB Part Number: C412246; Supplier 1: LCSC; Category: Capacitors - MLCC; Supplier Part Number 1: C412246; Tolerance: ±20%; Voltage Rating: 25V; Temperature Coefficient: X6S; RoHS: Yes; ComponentLink1Description: Datasheet; ComponentLink1URL: https://wmsc.lcsc.com/wmsc/upload/file/pdf/v2/lcsc/2304140030_Murata-Electronics-GRM033C81E104ME14D_C412246.pdf; ComponentLink2Description: JLCPCB Part URL; ComponentLink2URL: https://jlcpcb.com/partdetail/C412246; ComponentLink3Description: LCSC Part URL; ComponentLink3URL: https://lcsc.com/product-detail/Multilayer-Ceramic-Capacitors-MLCC---SMD-SMT_Murata-Electronics-Murata-Electronics-GRM033C81E104ME14D_C412246.html
footprint CAP-0201 (0201 (0603M) Capacitor)
pins: 1, 2

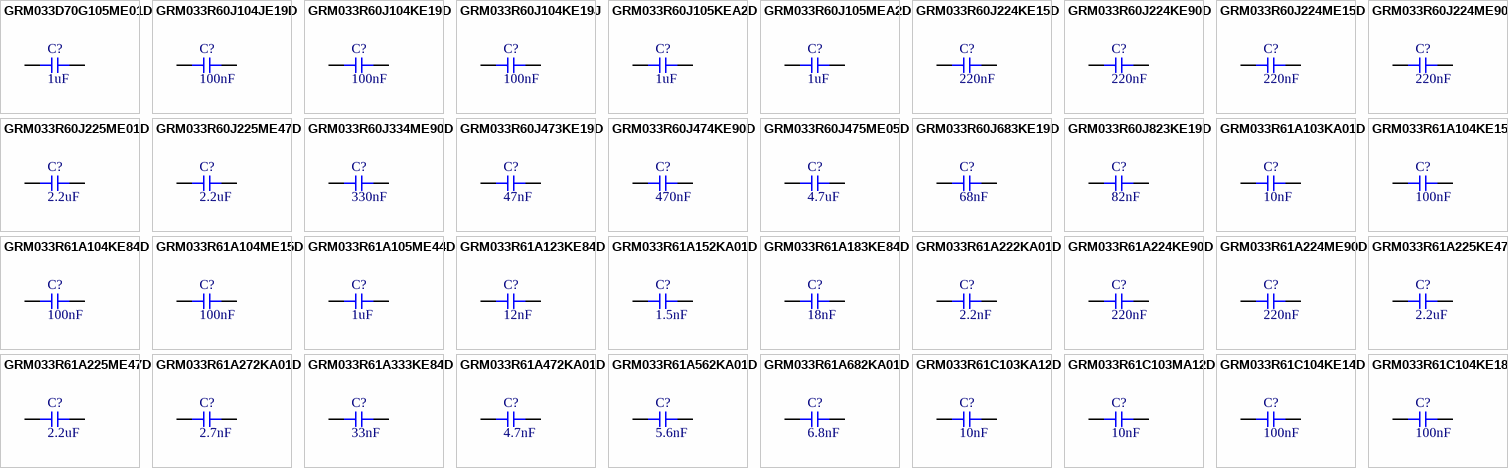
[diagram p17: symbols GRM033D70G105ME01D to GRM033R61C104KE18D]

## GRM033D70G105ME01D
designator C?  Capacitance: 1uF  (hidden comment: *)
Capacitor, Ceramic (MLCC), 1uF, 4V, X7T, SMD 0201; Manufacturer: Murata Electronics; Manufacturer Part Number: GRM033D70G105ME01D; Package Size: 0201; JLCPCB Basic Part: No; JLCPCB Part Number: C3018993; Supplier 1: LCSC; Category: Capacitors - MLCC; Supplier Part Number 1: C3018993; Voltage Rating: 4V; Temperature Coefficient: X7T; RoHS: Yes; ComponentLink1Description: Datasheet; ComponentLink1URL: https://wmsc.lcsc.com/wmsc/upload/file/pdf/v2/lcsc/2205191730_Murata-Electronics-GRM033D70G105ME01D_C3018993.pdf; ComponentLink2Description: JLCPCB Part URL; ComponentLink2URL: https://jlcpcb.com/partdetail/C3018993; ComponentLink3Description: LCSC Part URL; ComponentLink3URL: https://lcsc.com/product-detail/Multilayer-Ceramic-Capacitors-MLCC---SMD-SMT_Murata-Electronics-Murata-Electronics-GRM033D70G105ME01D_C3018993.html
footprint CAP-0201 (0201 (0603M) Capacitor)
pins: 1, 2

## GRM033R60J104JE19D
designator C?  Capacitance: 100nF  (hidden comment: *)
Capacitor, Ceramic (MLCC), 100nF, ±5%, 6.3V, X5R, ±5%, SMD 0201; Manufacturer: Murata Electronics; Manufacturer Part Number: GRM033R60J104JE19D; Package Size: 0201; JLCPCB Basic Part: No; JLCPCB Part Number: C710816; Supplier 1: LCSC; Category: Capacitors - MLCC; Supplier Part Number 1: C710816; Tolerance: ±5%; Voltage Rating: 6.3V; Temperature Coefficient: X5R; RoHS: Yes; ComponentLink1Description: Datasheet; ComponentLink1URL: https://wmsc.lcsc.com/wmsc/upload/file/pdf/v2/lcsc/2210190600_Murata-Electronics-GRM033R60J104JE19D_C710816.pdf; ComponentLink2Description: JLCPCB Part URL; ComponentLink2URL: https://jlcpcb.com/partdetail/C710816; ComponentLink3Description: LCSC Part URL; ComponentLink3URL: https://lcsc.com/product-detail/Multilayer-Ceramic-Capacitors-MLCC---SMD-SMT_Murata-Electronics-Murata-Electronics-GRM033R60J104JE19D_C710816.html
footprint CAP-0201 (0201 (0603M) Capacitor)
pins: 1, 2

## GRM033R60J104KE19D
designator C?  Capacitance: 100nF  (hidden comment: *)
Capacitor, Ceramic (MLCC), 100nF, ±10%, 6.3V, X5R, ±10%, SMD 0201; Manufacturer: Murata Electronics; Manufacturer Part Number: GRM033R60J104KE19D; Package Size: 0201; JLCPCB Basic Part: No; JLCPCB Part Number: C76928; Supplier 1: LCSC; Category: Capacitors - MLCC; Supplier Part Number 1: C76928; Tolerance: ±10%; Voltage Rating: 6.3V; Temperature Coefficient: X5R; RoHS: Yes; ComponentLink1Description: Datasheet; ComponentLink1URL: https://wmsc.lcsc.com/wmsc/upload/file/pdf/v2/lcsc/2304140030_Murata-Electronics-GRM033R60J104KE19D_C76928.pdf; ComponentLink2Description: JLCPCB Part URL; ComponentLink2URL: https://jlcpcb.com/partdetail/C76928; ComponentLink3Description: LCSC Part URL; ComponentLink3URL: https://lcsc.com/product-detail/Multilayer-Ceramic-Capacitors-MLCC---SMD-SMT_Murata-Electronics-Murata-Electronics-GRM033R60J104KE19D_C76928.html
footprint CAP-0201 (0201 (0603M) Capacitor)
pins: 1, 2

## GRM033R60J104KE19J
designator C?  Capacitance: 100nF  (hidden comment: *)
Capacitor, Ceramic (MLCC), 100nF, ±10%, 6.3V, X5R, ±10%, SMD 0201; Manufacturer: Murata Electronics; Manufacturer Part Number: GRM033R60J104KE19J; Package Size: 0201; JLCPCB Basic Part: No; JLCPCB Part Number: C913501; Supplier 1: LCSC; Category: Capacitors - MLCC; Supplier Part Number 1: C913501; Tolerance: ±10%; Voltage Rating: 6.3V; Temperature Coefficient: X5R; RoHS: Yes; ComponentLink1Description: Datasheet; ComponentLink1URL: https://wmsc.lcsc.com/wmsc/upload/file/pdf/v2/lcsc/2201131300_Murata-Electronics-GRM033R60J104KE19J_C913501.pdf; ComponentLink2Description: JLCPCB Part URL; ComponentLink2URL: https://jlcpcb.com/partdetail/C913501; ComponentLink3Description: LCSC Part URL; ComponentLink3URL: https://lcsc.com/product-detail/Multilayer-Ceramic-Capacitors-MLCC---SMD-SMT_Murata-Electronics-Murata-Electronics-GRM033R60J104KE19J_C913501.html
footprint CAP-0201 (0201 (0603M) Capacitor)
pins: 1, 2

## GRM033R60J105KEA2D
designator C?  Capacitance: 1uF  (hidden comment: *)
Capacitor, Ceramic (MLCC), 1uF, ±10%, 6.3V, X5R, ±10%, SMD 0201; Manufacturer: Murata Electronics; Manufacturer Part Number: GRM033R60J105KEA2D; Package Size: 0201; JLCPCB Basic Part: No; JLCPCB Part Number: C76929; Supplier 1: LCSC; Category: Capacitors - MLCC; Supplier Part Number 1: C76929; Tolerance: ±10%; Voltage Rating: 6.3V; Temperature Coefficient: X5R; RoHS: Yes; ComponentLink1Description: Datasheet; ComponentLink1URL: https://wmsc.lcsc.com/wmsc/upload/file/pdf/v2/lcsc/2304140030_Murata-Electronics-GRM033R60J105KEA2D_C76929.pdf; ComponentLink2Description: JLCPCB Part URL; ComponentLink2URL: https://jlcpcb.com/partdetail/C76929; ComponentLink3Description: LCSC Part URL; ComponentLink3URL: https://lcsc.com/product-detail/Multilayer-Ceramic-Capacitors-MLCC---SMD-SMT_Murata-Electronics-Murata-Electronics-GRM033R60J105KEA2D_C76929.html
footprint CAP-0201 (0201 (0603M) Capacitor)
pins: 1, 2

## GRM033R60J105MEA2D
designator C?  Capacitance: 1uF  (hidden comment: *)
Capacitor, Ceramic (MLCC), 1uF, ±20%, 6.3V, X5R, ±20%, SMD 0201; Manufacturer: Murata Electronics; Manufacturer Part Number: GRM033R60J105MEA2D; Package Size: 0201; JLCPCB Basic Part: No; JLCPCB Part Number: C76930; Supplier 1: LCSC; Category: Capacitors - MLCC; Supplier Part Number 1: C76930; Tolerance: ±20%; Voltage Rating: 6.3V; Temperature Coefficient: X5R; RoHS: Yes; ComponentLink1Description: Datasheet; ComponentLink1URL: https://wmsc.lcsc.com/wmsc/upload/file/pdf/v2/lcsc/1811081531_Murata-Electronics-GRM033R60J105MEA2D_C76930.pdf; ComponentLink2Description: JLCPCB Part URL; ComponentLink2URL: https://jlcpcb.com/partdetail/C76930; ComponentLink3Description: LCSC Part URL; ComponentLink3URL: https://lcsc.com/product-detail/Multilayer-Ceramic-Capacitors-MLCC---SMD-SMT_Murata-Electronics-Murata-Electronics-GRM033R60J105MEA2D_C76930.html
footprint CAP-0201 (0201 (0603M) Capacitor)
pins: 1, 2

## GRM033R60J224KE15D
designator C?  Capacitance: 220nF  (hidden comment: *)
Capacitor, Ceramic (MLCC), 220nF, ±10%, 6.3V, X5R, ±10%, SMD 0201; Manufacturer: Murata Electronics; Manufacturer Part Number: GRM033R60J224KE15D; Package Size: 0201; JLCPCB Basic Part: No; JLCPCB Part Number: C76931; Supplier 1: LCSC; Category: Capacitors - MLCC; Supplier Part Number 1: C76931; Tolerance: ±10%; Voltage Rating: 6.3V; Temperature Coefficient: X5R; RoHS: Yes; ComponentLink1Description: Datasheet; ComponentLink1URL: https://wmsc.lcsc.com/wmsc/upload/file/pdf/v2/lcsc/1811081531_Murata-Electronics-GRM033R60J224KE15D_C76931.pdf; ComponentLink2Description: JLCPCB Part URL; ComponentLink2URL: https://jlcpcb.com/partdetail/C76931; ComponentLink3Description: LCSC Part URL; ComponentLink3URL: https://lcsc.com/product-detail/Multilayer-Ceramic-Capacitors-MLCC---SMD-SMT_Murata-Electronics-Murata-Electronics-GRM033R60J224KE15D_C76931.html
footprint CAP-0201 (0201 (0603M) Capacitor)
pins: 1, 2

## GRM033R60J224KE90D
designator C?  Capacitance: 220nF  (hidden comment: *)
Capacitor, Ceramic (MLCC), 220nF, ±10%, 6.3V, X5R, ±10%, SMD 0201; Manufacturer: Murata Electronics; Manufacturer Part Number: GRM033R60J224KE90D; Package Size: 0201; JLCPCB Basic Part: No; JLCPCB Part Number: C2174021; Supplier 1: LCSC; Category: Capacitors - MLCC; Supplier Part Number 1: C2174021; Tolerance: ±10%; Voltage Rating: 6.3V; Temperature Coefficient: X5R; RoHS: Yes; ComponentLink1Description: Datasheet; ComponentLink1URL: https://wmsc.lcsc.com/wmsc/upload/file/pdf/v2/lcsc/2308111717_Murata-Electronics-GRM033R60J224KE90D_C2174021.pdf; ComponentLink2Description: JLCPCB Part URL; ComponentLink2URL: https://jlcpcb.com/partdetail/C2174021; ComponentLink3Description: LCSC Part URL; ComponentLink3URL: https://lcsc.com/product-detail/Multilayer-Ceramic-Capacitors-MLCC---SMD-SMT_Murata-Electronics-Murata-Electronics-GRM033R60J224KE90D_C2174021.html
footprint CAP-0201 (0201 (0603M) Capacitor)
pins: 1, 2

## GRM033R60J224ME15D
designator C?  Capacitance: 220nF  (hidden comment: *)
Capacitor, Ceramic (MLCC), 220nF, ±20%, 6.3V, X5R, ±20%, SMD 0201; Manufacturer: Murata Electronics; Manufacturer Part Number: GRM033R60J224ME15D; Package Size: 0201; JLCPCB Basic Part: No; JLCPCB Part Number: C76932; Supplier 1: LCSC; Category: Capacitors - MLCC; Supplier Part Number 1: C76932; Tolerance: ±20%; Voltage Rating: 6.3V; Temperature Coefficient: X5R; RoHS: Yes; ComponentLink1Description: Datasheet; ComponentLink1URL: https://wmsc.lcsc.com/wmsc/upload/file/pdf/v2/lcsc/1811081533_Murata-Electronics-GRM033R60J224ME15D_C76932.pdf; ComponentLink2Description: JLCPCB Part URL; ComponentLink2URL: https://jlcpcb.com/partdetail/C76932; ComponentLink3Description: LCSC Part URL; ComponentLink3URL: https://lcsc.com/product-detail/Multilayer-Ceramic-Capacitors-MLCC---SMD-SMT_Murata-Electronics-Murata-Electronics-GRM033R60J224ME15D_C76932.html
footprint CAP-0201 (0201 (0603M) Capacitor)
pins: 1, 2
